# Altium footprint library vertigo.PcbLib: 115 footprints (part 5 of 8)
Each footprint in its own frame and in the unit in brackets; x right, y up, seen from the top. Pads: shape width x height; smd on the part's side, far side on the other; paste and mask are expansions set on the pad; w line width, h text height; cw(c..) or ccw(c..) is an arc to the next point about the centre after c.
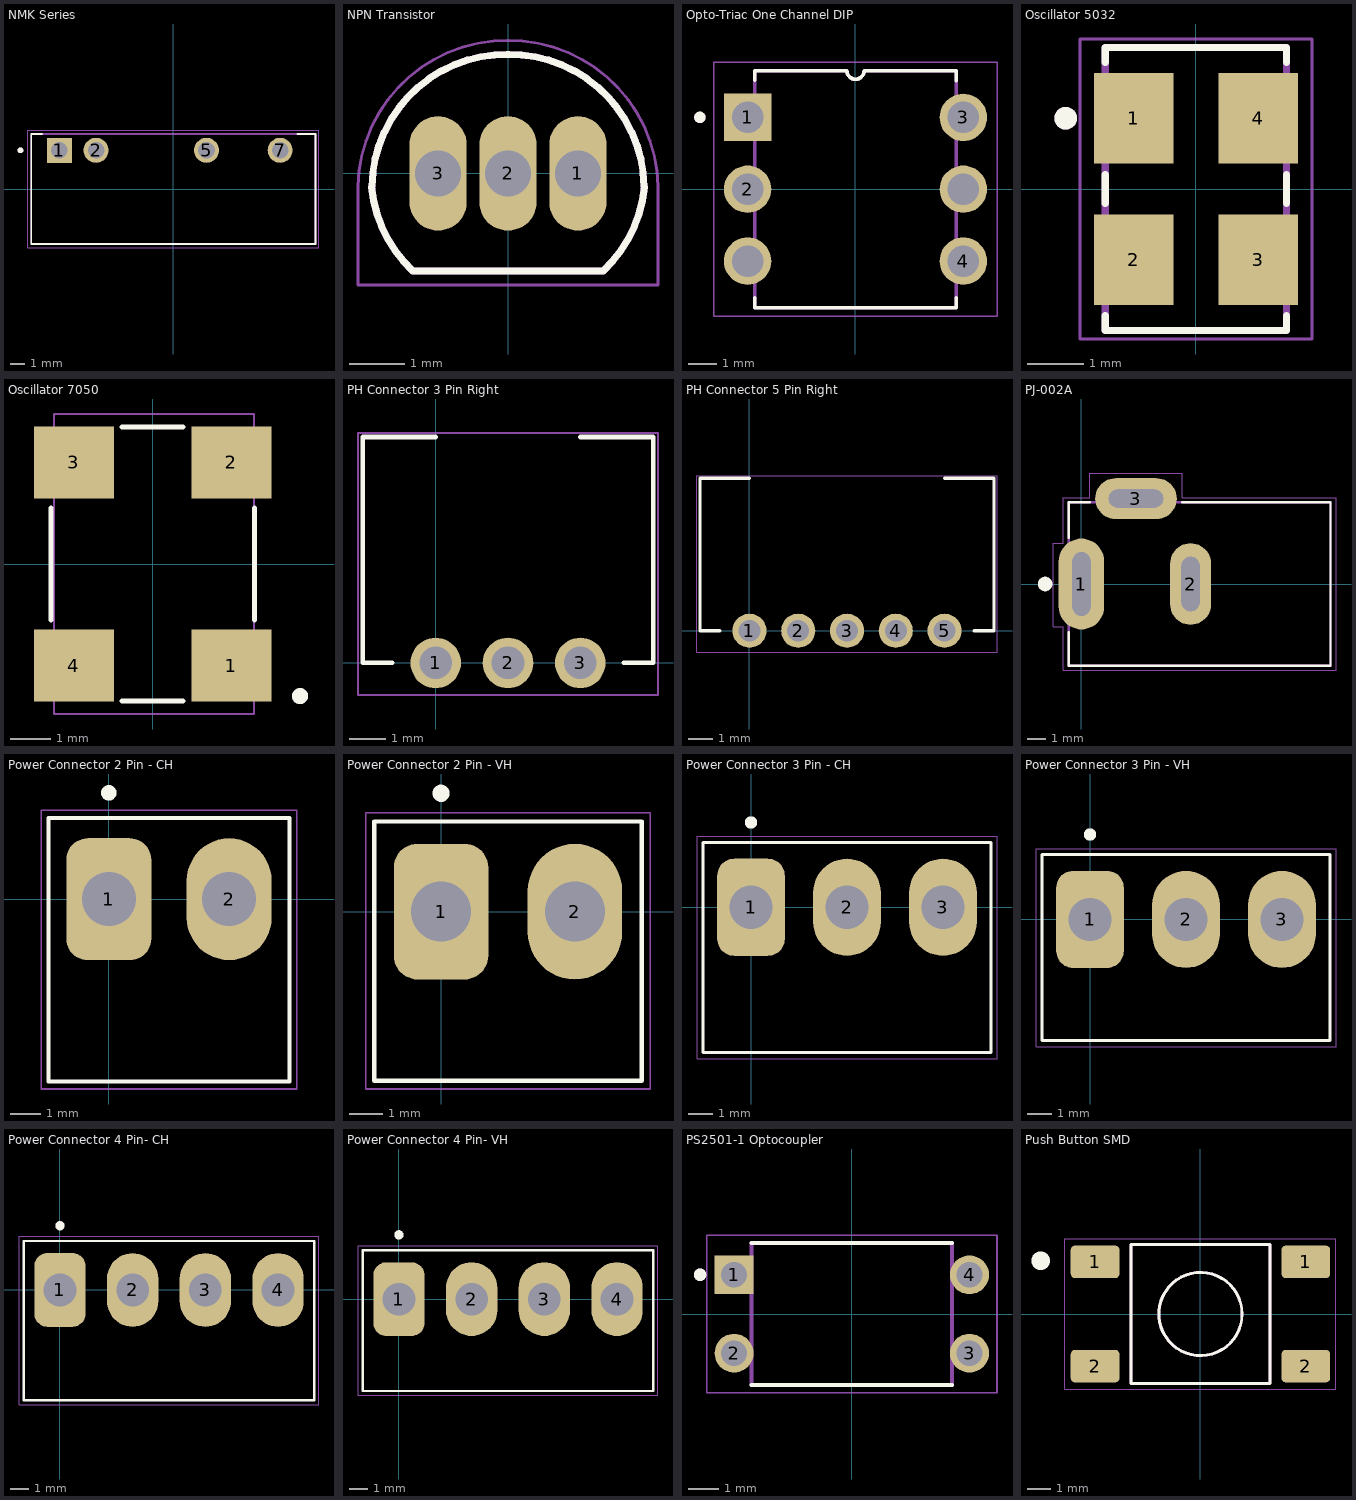
[diagram p4: the footprints below, top view; thin cyan lines are the x and y axes]

## NMK Series [mm] "DC/DC Converter"
pads (4):
  rect 1.725x1.725 hole 1.15: 1(-7.87,2.67)
  round 1.725 hole 1.15: 2(-5.33,2.67) 5(2.29,2.67) 7(7.37,2.67)
Top Overlay:
  circle w0.2: c-10.55,2.67 r0.1
  lines w0.127: -9.052,3.8 -9.8,3.8 -9.8,-3.8 9.8,-3.8 9.8,3.8 8.553,3.8
Mechanical 13:
  circle w0.2: c-10.55,2.67 r0.1
  lines w0.127: -9.8,-3.8 -9.8,3.8 9.8,3.8 9.8,-3.8 -9.8,-3.8
Mechanical 15:
  lines w0.05: -10.05,-4.05 -10.05,4.05 10.05,4.05 10.05,-4.05 -10.05,-4.05
3D body: height 10.15, standoff 0, extent -9.8,-3.8 9.8,3.8

## NPN Transistor [mm]
pads (3):
  oval 1.04x2.08 hole 0.84: 1(1.27,0) 2(0,0) 3(-1.27,0)
Top Overlay:
  lines w0.127: -2.476,-0.242 ccw(c-0.116,-0.036) -1.732,-1.769 ; -2.475,-0.24 cw(c-0.028,-0.282) 0.015,2.165 ; -1.725,-1.775 1.725,-1.775 ; -0.015,2.165 cw(c0.028,-0.282) 2.475,-0.24 ; 1.732,-1.769 ccw(c0.116,-0.036) 2.476,-0.242
Mechanical 13:
  lines w0.127: -2.476,-0.242 ccw(c-0.116,-0.036) -1.732,-1.769 ; -2.475,-0.24 cw(c-0.028,-0.282) 0.015,2.165 ; -1.725,-1.775 1.725,-1.775 ; -0.015,2.165 cw(c0.028,-0.282) 2.475,-0.24 ; 1.732,-1.769 ccw(c0.116,-0.036) 2.476,-0.242
Mechanical 15:
  lines w0.05: -2.725,-0.255 -2.725,-2.025 2.725,-2.025 2.725,-0.255 ; -2.725,-0.235 cw(c-0.028,-0.282) 0.02,2.415 ; -0.02,2.415 cw(c0.028,-0.282) 2.725,-0.235
3D body "2N3904--3DModel-STEP-1.STEP": height 8.44, standoff -12, extent -2.276,-1.548 2.283,2.285

## Opto-Triac One Channel DIP [mil] "DIP-6"
pads (6):
  rect 66x66 hole 44: 1(-150,100)
  round 66 hole 44: 2(-150,0) 3(150,100) 4(150,-100) ""(-150,-100) ""(150,0)
Top Overlay:
  circle w7.87: c-216.54,100 r3.94
  lines w5: -140,-151 -140,-165 140,-165 140,-151 ; -140,152 -140,165 -12,165 ccw(c0,165) 12,165 140,165 140,151
Mechanical 13:
  circle w7.87: c-216.54,100 r3.94
  lines w5: -140,-165 140,-165 140,165 12,165 cw(c0,165) -12,165 -140,165 -140,-165
Mechanical 15:
  lines w1.97: -196.85,-176.38 196.85,-176.38 196.85,176.38 -196.85,176.38 -196.85,-176.38
3D body "DIP6.STEP": height 185.04, standoff -102.36, extent -154.92,-142.91 154.92,142.91

## Oscillator 5032 [mm] "5X3.2mm"
pads (4):
  rect 1.4x1.6 smd: 1(-1.1,1.25) 2(-1.1,-1.25) 3(1.1,-1.25) 4(1.1,1.25)
Top Overlay:
  circle w0.2: c-2.3,1.25 r0.1
  lines w0.127: -1.6,-2.235 -1.6,-2.5 1.6,-2.5 1.6,-2.235 ; -1.6,-0.254 -1.6,0.254 ; -1.6,2.235 -1.6,2.5 1.6,2.5 1.6,2.235 ; 1.6,-0.254 1.6,0.254
Mechanical 13:
  circle w0.2: c-2.3,1.25 r0.1
  lines w0.127: -1.6,-2.5 1.6,-2.5 1.6,2.5 -1.6,2.5 -1.6,-2.5
Mechanical 15:
  lines w0.05: -2.05,-2.65 2.05,-2.65 2.05,2.65 -2.05,2.65 -2.05,-2.65
3D body "OSC5032.STEP": height 1.2, standoff 0, extent -1.6,-2.5 1.6,2.5

## Oscillator 7050 [mm]
pads (4):
  rect 2x1.8 smd: 1(1.968,-2.54) 2(1.968,2.54) 3(-1.968,2.54) 4(-1.968,-2.54)
Top Overlay:
  circle w0.2: c3.683,-3.302 r0.1
  lines w0.127: -2.54,-1.397 -2.54,1.397 ; -0.762,-3.429 0.762,-3.429 ; -0.762,3.429 0.762,3.429 ; 2.54,-1.397 2.54,1.397
Mechanical 15:
  lines w0.05: -2.468,-3.75 2.532,-3.75 2.532,3.75 -2.468,3.75 -2.468,-3.75
3D body "CB3LV-5I-20M0000.STEP": height 1.8, standoff 0, extent -2.5,-3.5 2.5,3.5

## PH Connector 3 Pin Right [mm] "PH Connector 3 Pin Right 2mm"
pads (3):
  round 1.4 hole 0.9: 1(0,0) 2(2,0) 3(4,0)
Top Overlay:
  lines w0.127: -1.207,0 -2.02,0 -2.02,6.25 0,6.25 ; 4,6.25 6.02,6.25 6.02,0 5.207,0
Mechanical 15:
  lines w0.05: -2.15,-0.889 -2.15,6.361 6.15,6.361 6.15,-0.889 -2.15,-0.889
3D body "JST - PH - SMD (R) - 3Pin - 2.00mm.STEP": height 5.38, standoff 0, extent -1.981,-0.562 5.981,6.223

## PH Connector 5 Pin Right [mm] "PH Connector 5 Pin Right 2mm"
pads (5):
  round 1.4 hole 0.9: 1(0,0) 2(2,0) 3(4,0) 4(6,0) 5(8,0)
Top Overlay:
  lines w0.127: -1.207,0 -2.02,0 -2.02,6.25 0,6.25 ; 8,6.25 10.02,6.25 10.02,0 9.207,0
Mechanical 15:
  lines w0.05: -2.15,-0.889 -2.15,6.361 10.15,6.361 10.15,-0.889 -2.15,-0.889
3D body "JST - PH - SMD (R) - 5Pin - 2.00mm.STEP": height 5.38, standoff 0, extent -1.981,-0.562 9.981,6.223

## PJ-002A [mm] "DC Power Connector"
pads (3):
  oval 2.5x5 hole 1 slot 3.5 at 90 deg: 1(0,0)
  oval 2.25x4.5 hole 1 slot 3 at 90 deg: 2(6,0)
  oval 4.5x2.25 hole 1 slot 3 at 0 deg: 3(3,4.7)
Top Overlay:
  circle w0.4: c-2,0 r0.2
  lines w0.127: -0.7,-2.65 -0.7,-4.5 13.7,-4.5 13.7,4.5 5.55,4.5 ; -0.7,2.55 -0.7,4.5 0.45,4.5
Mechanical 13:
  lines w0.127: -0.7,-4.5 13.7,-4.5 13.7,4.5 -0.7,4.5 -0.7,-4.5
Mechanical 15:
  lines w0.05: -1.55,-2.35 -1.55,2.25 -1,2.25 -1,4.75 0.45,4.75 0.45,6.1 5.55,6.1 5.55,4.75 14,4.75 14,-4.75 -1,-4.75 -1,-2.35 -1.55,-2.35
3D body "PJ-002A--3DModel-STEP-56544.STEP": height 11, standoff -3.5, extent -0.75,-4.5 13.65,4.9

## Power Connector 2 Pin - CH [mil] "2 Pin Connector 3.96mm"
pads (2):
  rrect50% 110x158 hole 70: 1(0,0)
  oval 110x158 hole 70: 2(155.91,0)
Top Overlay:
  circle w10: c0,137.8 r5
  lines w5: -77.95,-236.22 233.86,-236.22 233.86,105 -77.95,105 -77.95,-236.22
Mechanical 15:
  lines w1.97: -87.8,-245.91 -87.8,115 243.7,115 243.7,-245.91 -87.8,-245.91
3D body "JST - CH - Thru (V) - 2Pin - 3.96mm.stp": height 539, standoff -134, extent -70,-225 225.91,191.08

## Power Connector 2 Pin - VH [mil] "2 Pin Connector 3.96mm"
pads (2):
  rrect50% 110x158 hole 70: 1(0,0)
  oval 110x158 hole 70: 2(155.91,0)
Top Overlay:
  circle w10: c0,137.8 r5
  lines w5: -77.95,-196.85 233.86,-196.85 233.86,105 -77.95,105 -77.95,-196.85
Mechanical 15:
  lines w1.97: -87.8,-206.54 -87.8,115 243.7,115 243.7,-206.54 -87.8,-206.54
3D body "JST - VH - Thru (V) - 2Pin - 3.96mm.stp": height 408, standoff -156, extent -90.45,-183 246.36,159

## Power Connector 3 Pin - CH [mil] "3 Pin Connector 3.96mm"
pads (3):
  rrect50% 110x158 hole 70: 1(0,0)
  oval 110x158 hole 70: 2(155.91,0) 3(311.81,0)
Top Overlay:
  circle w10: c0,137.8 r5
  lines w5: -77.95,105 -77.95,-236.22 389.76,-236.22 389.76,105 ; -77.95,105.31 389.76,105.31
Mechanical 15:
  lines w1.97: -87.8,-245.91 -87.8,115 399.61,115 399.61,-245.91 -87.8,-245.91
3D body "JST - CH - Thru (V) - 3Pin - 3.96mm.stp": height 539, standoff -134, extent -70,-225 381.81,191.08

## Power Connector 3 Pin - VH [mil] "3 Pin Connector 3.96mm"
pads (3):
  rrect50% 110x158 hole 70: 1(0,0)
  oval 110x158 hole 70: 2(155.91,0) 3(311.81,0)
Top Overlay:
  circle w10: c0,137.8 r5
  lines w5: -77.95,105 -77.95,-196.85 389.76,-196.85 389.76,105 ; -77.95,105.31 389.76,105.31
Mechanical 15:
  lines w1.97: -87.8,-206.54 -87.8,115 399.61,115 399.61,-206.54 -87.8,-206.54
3D body "JST - VH - Thru (V) - 3Pin - 3.96mm.stp": height 408, standoff -156, extent -90.45,-183 402.27,159

## Power Connector 4 Pin- CH [mil] "4 Pin Connector 3.96mm"
pads (4):
  rrect50% 110x158 hole 70: 1(0,0)
  oval 110x158 hole 70: 2(155.91,0) 3(311.81,0) 4(467.72,0)
Top Overlay:
  circle w10: c0,137.8 r5
  lines w5: -77.95,-236.22 -77.95,105 545.67,105 545.67,-236.22 -77.95,-236.22
Mechanical 15:
  lines w1.97: -87.8,-245.91 -87.8,115 555.51,115 555.51,-245.91 -87.8,-245.91
3D body "JST - CH - Thru (V) - 4Pin - 3.96mm.stp": height 539, standoff -134, extent -70,-225 537.72,191.08

## Power Connector 4 Pin- VH [mil] "4 Pin Connector 3.96mm"
pads (4):
  rrect50% 110x158 hole 70: 1(0,0)
  oval 110x158 hole 70: 2(155.91,0) 3(311.81,0) 4(467.72,0)
Top Overlay:
  circle w10: c0,137.8 r5
  lines w5: -77.95,-196.85 -77.95,105 545.67,105 545.67,-196.85 -77.95,-196.85
Mechanical 15:
  lines w1.97: -87.8,-206.54 -87.8,115 555.51,115 555.51,-206.54 -87.8,-206.54
3D body "JST - VH - Thru (V) - 4Pin - 3.96mm.stp": height 408, standoff -156, extent -90.45,-183 558.17,159

## PS2501-1 Optocoupler [mm] "DIP-4 Package"
pads (4):
  rect 1.26x1.26 hole 0.84: 1(-3.81,1.27)
  round 1.26 hole 0.84: 2(-3.81,-1.27) 3(3.81,-1.27) 4(3.81,1.27)
Top Overlay:
  circle w0.2: c-4.91,1.27 r0.1
  lines w0.127: -3.25,-2.3 3.25,-2.3 ; -3.25,2.3 3.25,2.3
Mechanical 13:
  circle w0.2: c-4.91,1.27 r0.1
  lines w0.127: -3.25,-2.3 3.25,-2.3 3.25,2.3 -3.25,2.3 -3.25,-2.3
Mechanical 15:
  lines w0.05: -4.7,-2.55 4.7,-2.55 4.7,2.55 -4.7,2.55 -4.7,-2.55
3D body "PS2501-1.STEP": height 5, standoff -3.3, extent -4.529,-2.3 4.529,2.3

## Push Button SMD [mm] "4 Pin Push Button SMD"
pads (4):
  rrect25% 2.1x1.4 smd: 1(-4.55,2.25) 1(4.55,2.25) 2(-4.55,-2.25) 2(4.55,-2.25)
Top Overlay:
  circle w0.127: c0,0 r1.796
  circle w0.4: c-6.9,2.3 r0.2
  lines w0.127: -3,-3 -3,3 3,3 3,-3 -3,-3
Mechanical 13:
  circle w0.127: c0,0 r1.796
  lines w0.127: -3,-3 -3,3 3,3 3,-3 -3,-3
Mechanical 15:
  lines w0.05: -5.85,-3.25 5.85,-3.25 5.85,3.25 -5.85,3.25 -5.85,-3.25
3D body "FSM6JSMATR--3DModel-STEP-56544.STEP": height 7.26, standoff 0, extent -5,-3 5,3